# Altium footprint library SOT SOD TO DAPK.PcbLib: 156 footprints (part 4 of 10)
Each footprint in its own frame and in the unit in brackets; x right, y up, seen from the top. Pads: shape width x height; smd on the part's side, far side on the other; paste and mask are expansions set on the pad; w line width, h text height; cw(c..) or ccw(c..) is an arc to the next point about the centre after c.
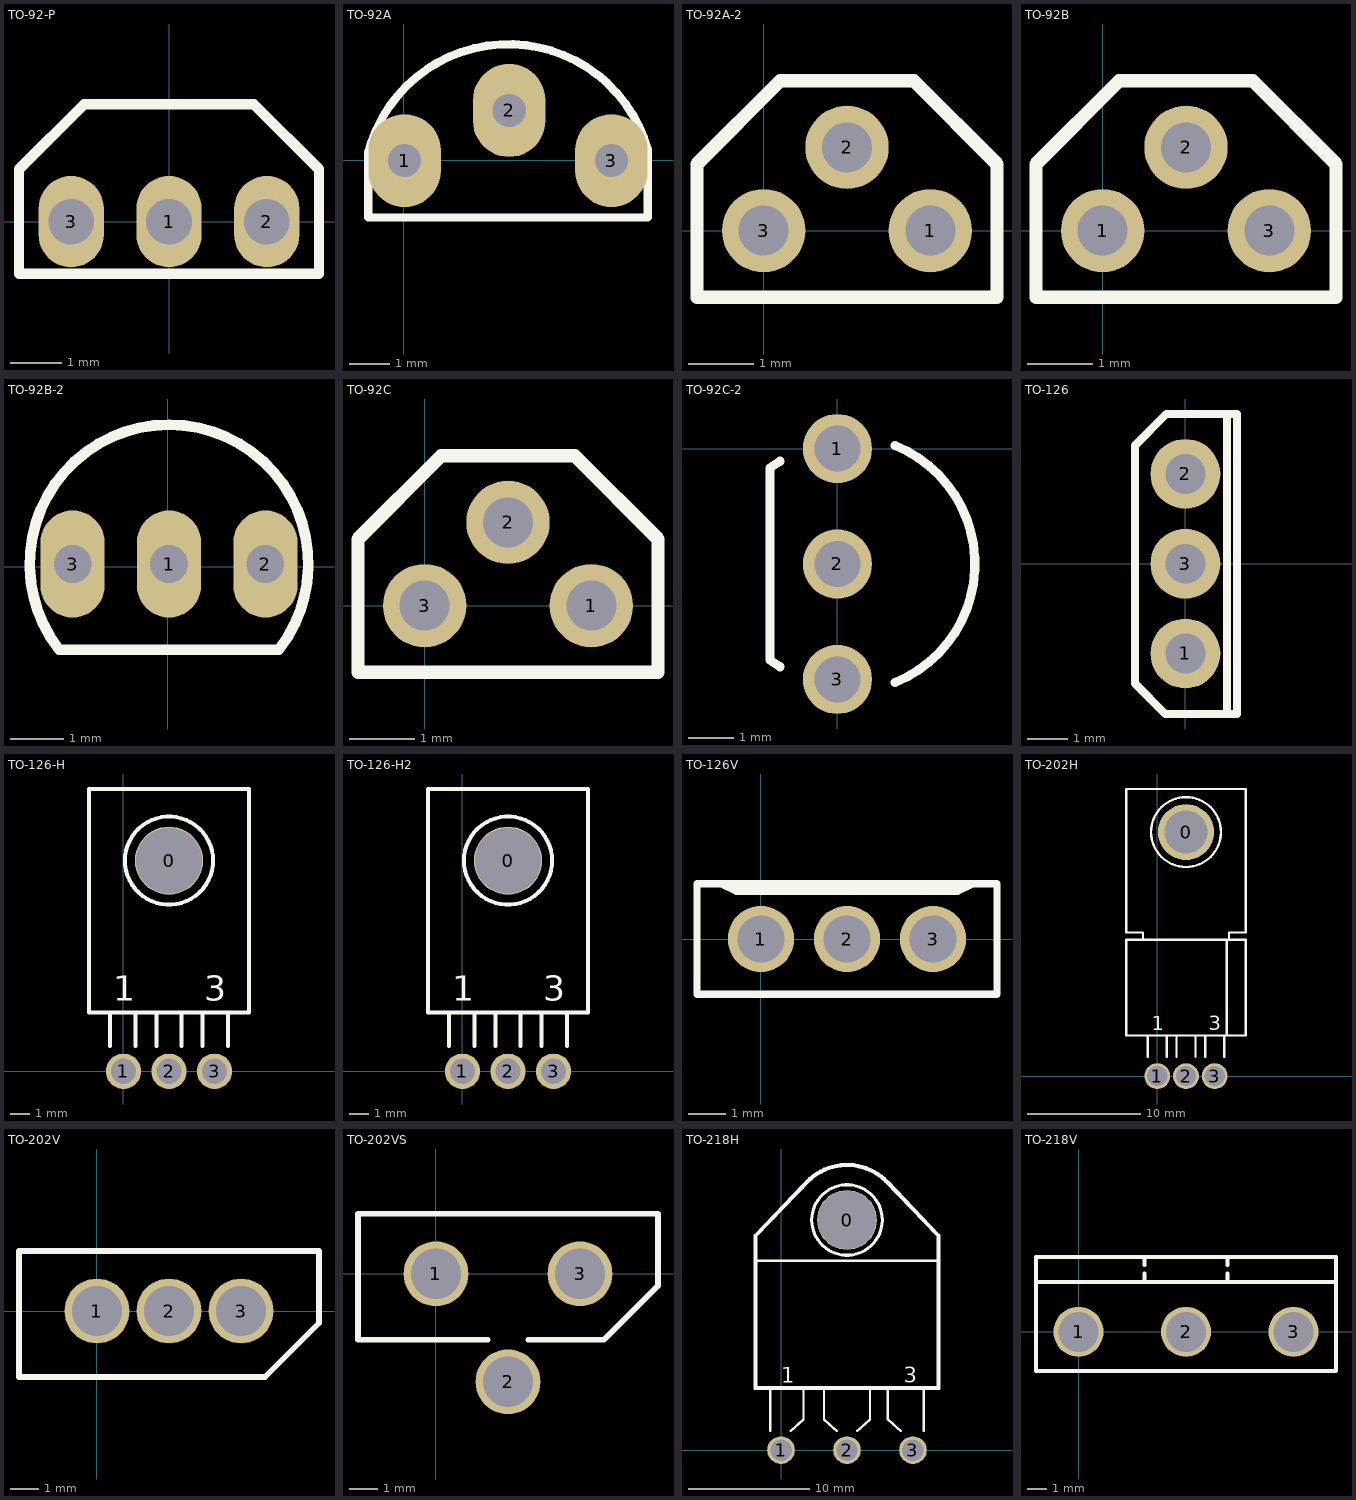
[diagram p3: the footprints below, top view; thin cyan lines are the x and y axes]

## TO-92-P [mil]
pads (3):
  oval 50x70 hole 35: 1(0,0) 2(75,0) 3(-75,0)
Top Overlay:
  lines w8: -115,-40 115,-40 115,40 65,90 -65,90 -115,40 -115,-40
3D body "TO-92B.STEP": height 314.96, standoff -119.01, extent -99.49,-44.88 89.49,109.84

## TO-92A [mil]
pads (3):
  oval 70x90 hole 32: 1(0.83,-0.5) 2(102,48) 3(200.83,-0.5)
Top Overlay:
  lines w8: -34.55,6.14 cw(c101.24,-27.93) 236,10 ; -34.17,8 -34.17,-55.5 235.83,-55.5 235.83,9.5
3D body "SW3dPS-TO-66.STEP": height 239.11, standoff -391.82, extent -319.77,-387.3 920.59,300.71
3D body "User Library-TO-92-5.STEP": height 268.98, standoff -47.56, extent -11.81,-56 211.81,93.61

## TO-92A-2 [mil]
pads (3):
  round 50 hole 30: 1(100,0) 2(50,50) 3(0,0)
Top Overlay:
  lines w8: -40,-40 -40,40 10,90 90,90 140,40 140,-40 -40,-40
3D body "micromsd_n.stp": height 269.29, standoff -118.11, extent -39.17,-37.8 138.78,96.06

## TO-92B [mil]
pads (3):
  round 50 hole 30: 1(0,0) 2(50,50) 3(100,0)
Top Overlay:
  lines w8: -40,-40 -40,40 10,90 90,90 140,40 140,-40 -40,-40
3D body "TO-92B.STEP": height 314.96, standoff -119.01, extent -44.49,-59.88 144.49,94.84

## TO-92B-2 [mm]
height 5.33
pads (3):
  oval 1.2x2 hole 0.7: 1(0.025,0.051) 2(1.825,0.051) 3(-1.775,0.051)
Top Overlay:
  lines w0.2: -2.023,-1.55 cw(c0.025,0.051) 2.074,-1.55 ; -1.965,-1.549 2.015,-1.549
3D body "NPN TO-92 3L (2 54mm).step": height 6.83, standoff -12.7, extent -2.355,-1.42 2.405,2.21

## TO-92C [mil]
pads (3):
  round 50 hole 30: 1(100,0) 2(50,50) 3(0,0)
Top Overlay:
  lines w8: -40,-40 -40,40 10,90 90,90 140,40 140,-40 -40,-40
3D body "TO-92B.STEP": height 314.96, standoff -119.01, extent -44.49,-59.88 144.49,94.84

## TO-92C-2 [mil]
pads (3):
  round 60 hole 40: 1(0,0) 2(0,-100) 3(0,-200)
Top Overlay:
  lines w7.87: -49.71,-189.08 -58.33,-183.33 -58.33,-16.67 -49.71,-10.92 ; 49.85,-202.76 ccw(c8.33,-100) 49.85,2.76
3D body "TO-92B.STEP": height 314.96, standoff -119.01, extent -54.88,-194.49 99.84,-5.51

## TO-126 [mm] "BD135"
pads (3):
  round 1.75 hole 1: 1(0,-2.25) 2(0,2.25) 3(0,0)
Top Overlay:
  lines w0.2: 1.041,-3.734 1.041,3.734 ; -1.268,-3.005 -0.506,-3.767 1.295,-3.767 1.295,3.752 -0.48,3.752 -1.268,2.964 -1.268,-3.005
3D body "BD135 (TO-126 SOT32) v4.step": height 14.6, standoff -3.35, extent -1.797,-3.934 0.903,3.866

## TO-126-H [mil]
pads (4):
  round 135 hole 130: 0(90,416.67)
  round 70 hole 50: 1(0,0) 2(90,0) 3(180,0)
Top Overlay:
  circle w7.87: c90,416.67 r87.19
  lines w7.87: -26.67,50 -26.67,116.67 ; 23.33,50 23.33,116.67 ; 65,50 65,116.67 ; 115,50 115,116.67 ; 156.67,50 156.67,116.67 ; 206.67,50 206.67,116.67 ; -26.67,116.67 248.33,116.67 248.33,558.33 -68.33,558.33 -68.33,116.67 -26.67,116.67
  text "1" at -20,140 h50
  text "3" at 160,140 h50
3D body "User Library-2N5194,SPNP,60V 1_5A 40W.step": height 100, standoff -62.5, extent -60,-16.34 240,578.66

## TO-126-H2 [mil]
pads (4):
  round 135 hole 130: 0(90,416.67)
  round 70 hole 50: 1(0,0) 2(90,0) 3(180,0)
Top Overlay:
  circle w7.87: c90,416.67 r87.19
  lines w7.87: -26.67,50 -26.67,116.67 ; 23.33,50 23.33,116.67 ; 65,50 65,116.67 ; 115,50 115,116.67 ; 156.67,50 156.67,116.67 ; 206.67,50 206.67,116.67 ; -26.67,116.67 -68.33,116.67 -68.33,558.33 248.33,558.33 248.33,116.67 -26.67,116.67
  text "3" at 160,140 h50
  text "1" at -20,140 h50
3D body "TO-126.STEP": height 49.21, standoff -78.74, extent -69.96,-73.9 245,563.9

## TO-126V [mil]
pads (3):
  round 70 hole 50: 1(0,0) 2(90.83,0) 3(181.67,0)
Top Overlay:
  lines w7.87: -42.5,58.33 -25.83,50.46 207.5,50.46 224.17,58.33 ; -67.5,-58.33 -67.5,58.33 249.17,58.33 249.17,-58.33 -67.5,-58.33
3D body "TO-126.STEP": height 559.06, standoff -78.74, extent -64.96,-67.95 250,60

## TO-202H [mil]
pads (4):
  round 195 hole 150: 0(100,850)
  round 90 hole 70: 1(0,0) 2(100,0) 3(200,0)
Top Overlay:
  circle w7.87: c100,850 r121.66
  lines w7.87: -50,475 -50,500 -108.33,500 -108.33,1000 308.33,1000 308.33,500 250,500 250,475 ; -33.33,66.93 -33.33,141.67 ; 33.33,66.93 33.33,141.67 ; 66.67,66.93 66.67,141.67 ; 133.33,66.93 133.33,141.67 ; 166.67,66.93 166.67,141.67 ; 233.33,66.93 233.33,141.67 ; 241.67,141.67 241.67,475 ; -108.33,141.67 -108.33,475 308.33,475 308.33,141.67 -108.33,141.67
  text "1" at -20,160 h50
  text "3" at 180,160 h50

## TO-202V [mil]
pads (3):
  round 90 hole 70: 1(0,0) 2(100,0) 3(200,0)
Top Overlay:
  lines w7.87: -108.33,-91.67 233.33,-91.67 308.33,-16.67 308.33,83.33 -108.33,83.33 -108.33,-91.67

## TO-202VS [mil]
pads (3):
  round 90 hole 70: 1(0,0) 2(100,-150) 3(200,0)
Top Overlay:
  lines w7.87: -108.33,-91.67 72.04,-91.67 ; 127.96,-91.67 233.33,-91.67
  lines w8: -108.33,-91.67 -108.33,83.33 308.33,83.33 308.33,-16.67 233.33,-91.67

## TO-218H [mil]
pads (4):
  round 195 hole 190: 0(215,750)
  round 90 hole 70: 1(0,0) 2(215,0) 3(430,0)
Top Overlay:
  circle w10: c215,750 r115
  lines w7.87: -35,62.99 -35,200 ; 31.67,62.99 73.33,100 73.33,200 ; 73.33,866.67 -85,700 -85,616.67 ; 95,880 -80,700 -80,205 510,205 510,700 340,875 ; 140,200 140,100 181.67,62.99 ; 248.33,62.99 290,100 290,200 ; 348.33,200 348.33,100 390,62.99 ; 348.33,875 515,700 515,616.67 ; 465,62.99 465,200 ; -85,616.67 -85,200 515,200 515,616.67 ; -85,616.67 515,616.67
  lines w8: 73.17,864.85 cw(c215,750) 348.47,874.46 ; 94.51,879.21 cw(c215,750) 339.92,874.92
  text "3" at 400,220 h50
  text "1" at 0,220 h50
3D body "User Library-TO218-O.STEP": height 189.57, standoff -118.11, extent -95,-21.62 495.55,971.62

## TO-218V [mil]
pads (3):
  round 100 hole 80: 1(0,0) 2(215,0) 3(430,0)
Top Overlay:
  lines w7.87: -85,100 515,100 ; 131.67,100 131.67,116.67 ; 131.67,133.33 131.67,150 ; 298.33,100 298.33,116.67 ; 298.33,133.33 298.33,150 ; -85,-78.74 515,-78.74 515,150 -85,150 -85,-78.74
3D body "SW3dPS-TO-218-1.STEP": height 1048.11, standoff -322.98, extent -84.21,-82.91 514.22,110